# Altium footprint library Connectors.PcbLib: 268 footprints (part 9 of 21)
Each footprint in its own frame and in the unit in brackets; x right, y up, seen from the top. Pads: shape width x height; smd on the part's side, far side on the other; paste and mask are expansions set on the pad; w line width, h text height; cw(c..) or ccw(c..) is an arc to the next point about the centre after c.
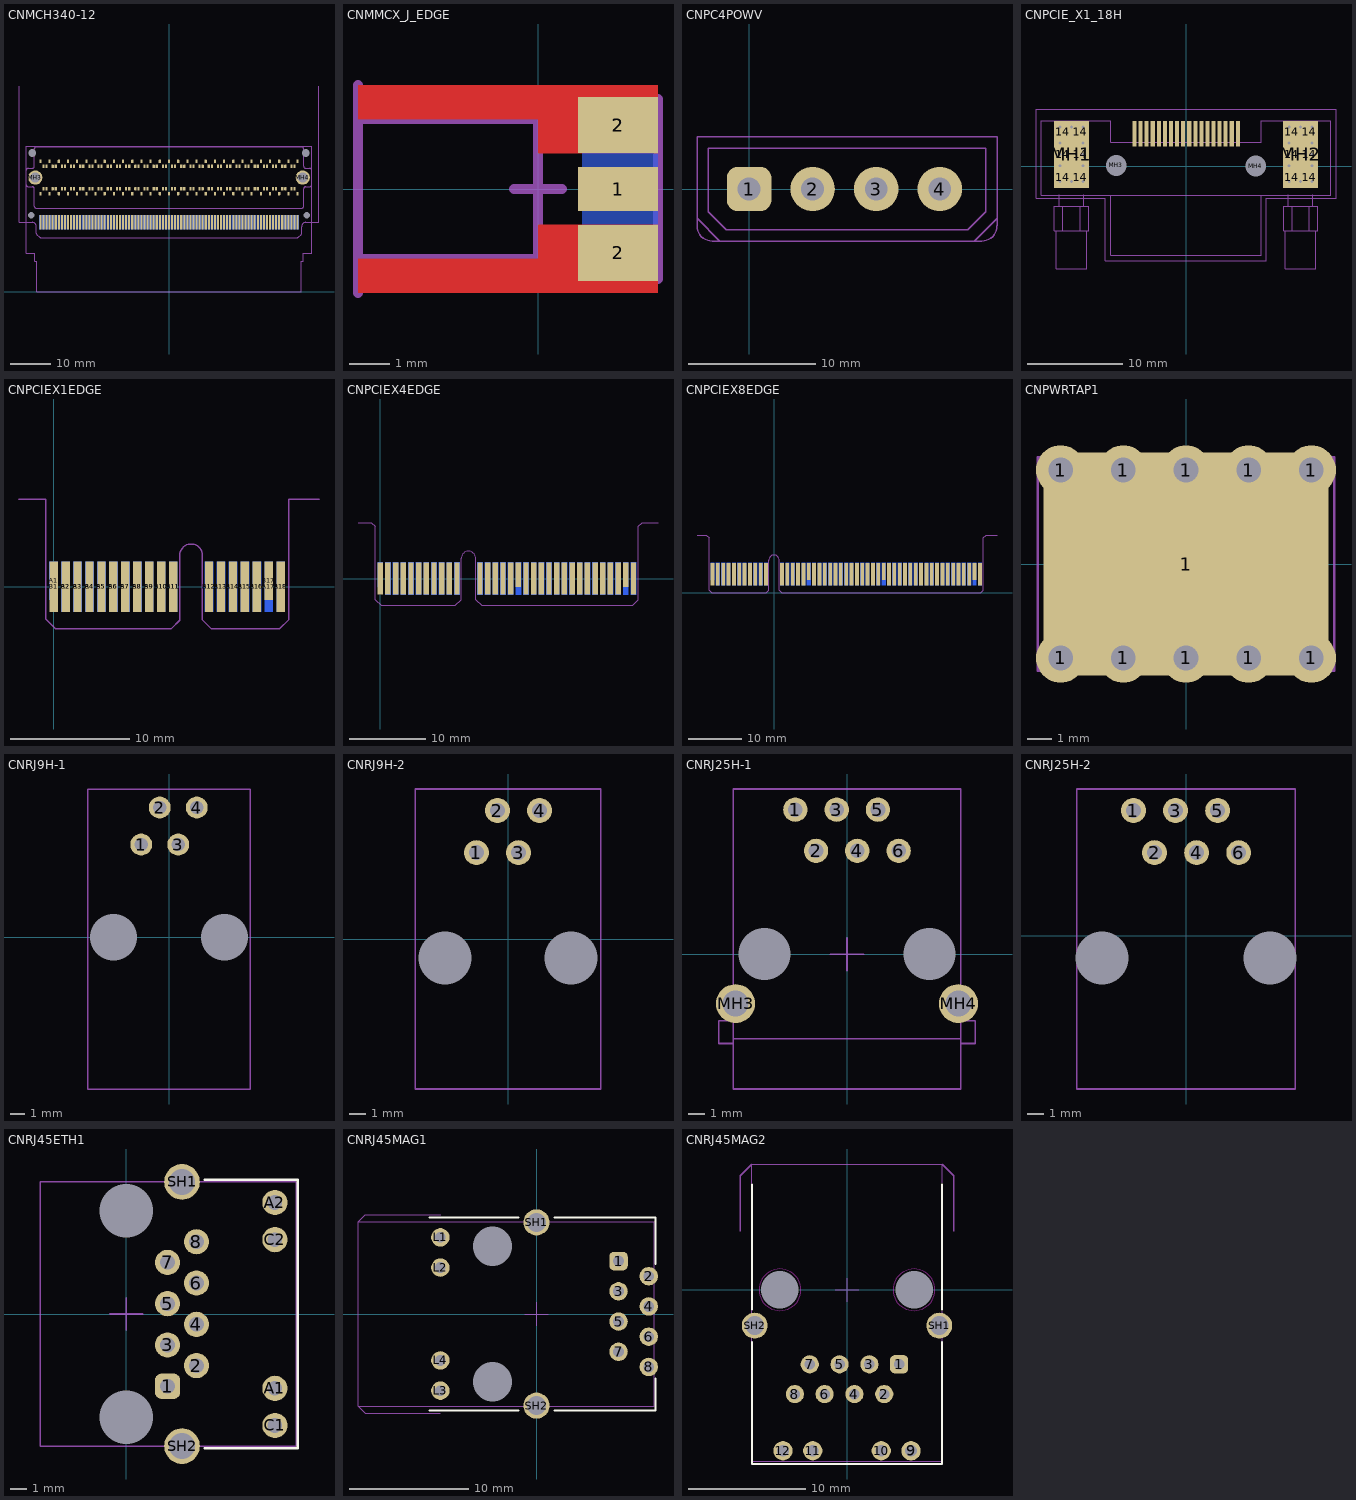
[diagram p8: the footprints below, top view; thin cyan lines are the x and y axes]

## CNMCH340-12 [mm] "MCH-1,2 horizontal connector plug 340 pin"
height 11.95
pads (348):
  rrect50% 0.53x0.9 smd: A1(31.5,31.95) A2(30.75,30.75) A3(30,30.75) A4(29.25,31.95) A5(28.5,30.75) A6(27.75,30.75) A7(27,31.95) A7(27,31.95) A8(26.25,30.75) A9(25.5,30.75) A10(24.75,31.95) A11(24,30.75) A12(23.25,30.75) A13(22.5,31.95) A14(21.75,30.75) A15(21,30.75) A16(20.25,31.95) A17(19.5,30.75) A18(18.75,30.75) A19(18,31.95) A20(17.25,30.75) A21(16.5,30.75) A22(15.75,31.95) A23(15,30.75) A24(14.25,30.75) A25(13.5,31.95) A26(12.75,30.75) A27(12,30.75) A28(11.25,31.95) A29(10.5,30.75) A30(9.75,30.75) A31(9,31.95) A32(8.25,30.75) A33(7.5,30.75) A34(6.75,31.95) A35(6,30.75) A36(5.25,30.75) A37(4.5,31.95) A38(3.75,30.75) A39(3,30.75) A40(2.25,31.95) A41(1.5,30.75) A42(0.75,30.75) A43(0,31.95) A44(-0.75,30.75) A45(-1.5,30.75) A46(-2.25,31.95) A47(-3,30.75) A48(-3.75,30.75) A49(-4.5,31.95) A50(-5.25,30.75) A51(-6,30.75) A52(-6.75,31.95) A53(-7.5,30.75) A54(-8.25,30.75) A55(-9,31.95) A56(-9.75,30.75) A57(-10.5,30.75) A58(-11.25,31.95) A59(-12,30.75) A60(-12.75,30.75) A61(-13.5,31.95) A62(-14.25,30.75) A63(-15,30.75) A64(-15.75,31.95) A65(-16.5,30.75) A66(-17.25,30.75) A67(-18,31.95) A68(-18.75,30.75) A69(-19.5,30.75) A70(-20.25,31.95) A71(-21,30.75) A72(-21.75,30.75) A73(-22.5,31.95) A74(-23.25,30.75) A75(-24,30.75) A76(-24.75,31.95) A77(-25.5,30.75) A78(-26.25,30.75) A79(-27,31.95) A80(-27.75,30.75) A81(-28.5,30.75) A82(-29.25,31.95) A83(-30,30.75) A84(-30.75,30.75) A85(-31.5,31.95) A86(-31.5,24.05) A87(-30.75,25.25) A88(-30,25.25) A89(-29.25,24.05) A90(-28.5,25.25) A91(-27.75,25.25) A92(-27,24.05) A93(-26.25,25.25) A94(-25.5,25.25) A95(-24.75,24.05) A96(-24,25.25) A97(-23.25,25.25) A98(-22.5,24.05) A99(-21.75,25.25) A100(-21,25.25) A101(-20.25,24.05) A102(-19.5,25.25) A103(-18.75,25.25) A104(-18,24.05) A105(-17.25,25.25) A106(-16.5,25.25) A107(-15.75,24.05) A108(-15,25.25) A109(-14.25,25.25) A110(-13.5,24.05) A111(-12.75,25.25) A112(-12,25.25) A113(-11.25,24.05) A114(-10.5,25.25) A115(-9.75,25.25) A116(-9,24.05) A117(-8.25,25.25) A118(-7.5,25.25) A119(-6.75,24.05) A120(-6,25.25) A121(-5.25,25.25) A122(-4.5,24.05) A123(-3.75,25.25) A124(-3,25.25) A125(-2.25,24.05) A126(-1.5,25.25) A127(-0.75,25.25) A128(0,24.05) A129(0.75,25.25) A130(1.5,25.25) A131(2.25,24.05) A132(3,25.25) A133(3.75,25.25) A134(4.5,24.05) A135(5.25,25.25) A136(6,25.25) A137(6.75,24.05) A138(7.5,25.25) A139(8.25,25.25) A140(9,24.05) A141(9.75,25.25) A142(10.5,25.25) A143(11.25,24.05) A144(12,25.25) A145(12.75,25.25) A146(13.5,24.05) A147(14.25,25.25) A148(15,25.25) A149(15.75,24.05) A150(16.5,25.25) A151(17.25,25.25) A152(18,24.05) A153(18.75,25.25) A154(19.5,25.25) A155(20.25,24.05) A156(21,25.25) A157(21.75,25.25) A158(22.5,24.05) A159(23.25,25.25) A160(24,25.25) A161(24.75,24.05) A162(25.5,25.25) A163(26.25,25.25) A164(27,24.05) A165(27.75,25.25) A166(28.5,25.25) A167(29.25,24.05) A168(30,25.25) A169(30.75,25.25) A170(31.5,24.05)
  rect 0.5x3.5 smd: B1(31.5,17.05) B2(30.75,17.05) B3(30,17.05) B4(29.25,17.05) B5(28.5,17.05) B6(27.75,17.05) B7(27,17.05) B8(26.25,17.05) B9(25.5,17.05) B10(24.75,17.05) B11(24,17.05) B12(23.25,17.05) B13(22.5,17.05) B14(21.75,17.05) B15(21,17.05) B16(20.25,17.05) B17(19.5,17.05) B18(18.75,17.05) B19(18,17.05) B20(17.25,17.05) B21(16.5,17.05) B22(15.75,17.05) B23(15,17.05) B24(14.25,17.05) B25(13.5,17.05) B26(12.75,17.05) B27(12,17.05) B28(11.25,17.05) B29(10.5,17.05) B30(9.75,17.05) B31(9,17.05) B32(8.25,17.05) B33(7.5,17.05) B34(6.75,17.05) B35(6,17.05) B36(5.25,17.05) B37(4.5,17.05) B38(3.75,17.05) B39(3,17.05) B40(2.25,17.05) B41(1.5,17.05) B42(0.75,17.05) B43(0,17.05) B44(-0.75,17.05) B45(-1.5,17.05) B46(-2.25,17.05) B47(-3,17.05) B48(-3.75,17.05) B49(-4.5,17.05) B50(-5.25,17.05) B51(-6,17.05) B52(-6.75,17.05) B53(-7.5,17.05) B54(-8.25,17.05) B55(-9,17.05) B56(-9.75,17.05) B57(-10.5,17.05) B58(-11.25,17.05) B59(-12,17.05) B60(-12.75,17.05) B61(-13.5,17.05) B62(-14.25,17.05) B63(-15,17.05) B64(-15.75,17.05) B65(-16.5,17.05) B66(-17.25,17.05) B67(-18,17.05) B68(-18.75,17.05) B69(-19.5,17.05) B70(-20.25,17.05) B71(-21,17.05) B72(-21.75,17.05) B73(-22.5,17.05) B74(-23.25,17.05) B75(-24,17.05) B76(-24.75,17.05) B77(-25.5,17.05) B78(-26.25,17.05) B79(-27,17.05) B80(-27.75,17.05) B81(-28.5,17.05) B82(-29.25,17.05) B83(-30,17.05) B84(-30.75,17.05) B85(-31.5,17.05)
  rect 0.5x3.5 smd far side: B86(-31.5,17.05) B86(-31.5,17.05) B87(-30.75,17.05) B88(-30,17.05) B89(-29.25,17.05) B90(-28.5,17.05) B91(-27.75,17.05) B92(-27,17.05) B93(-26.25,17.05) B94(-25.5,17.05) B95(-24.75,17.05) B96(-24,17.05) B97(-23.25,17.05) B98(-22.5,17.05) B99(-21.75,17.05) B100(-21,17.05) B101(-20.25,17.05) B102(-19.5,17.05) B103(-18.75,17.05) B104(-18,17.05) B105(-17.25,17.05) B106(-16.5,17.05) B107(-15.75,17.05) B108(-15,17.05) B109(-14.25,17.05) B110(-13.5,17.05) B111(-12.75,17.05) B112(-12,17.05) B113(-11.25,17.05) B114(-10.5,17.05) B115(-9.75,17.05) B116(-9,17.05) B117(-8.25,17.05) B118(-7.5,17.05) B119(-6.75,17.05) B120(-6,17.05) B121(-5.25,17.05) B122(-4.5,17.05) B123(-3.75,17.05) B124(-3,17.05) B125(-2.25,17.05) B126(-1.5,17.05) B127(-0.75,17.05) B128(0,17.05) B129(0.75,17.05) B130(1.5,17.05) B131(2.25,17.05) B132(3,17.05) B133(3.75,17.05) B134(4.5,17.05) B135(5.25,17.05) B136(6,17.05) B137(6.75,17.05) B138(7.5,17.05) B139(8.25,17.05) B140(9,17.05) B141(9.75,17.05) B142(10.5,17.05) B143(11.25,17.05) B144(12,17.05) B145(12.75,17.05) B146(13.5,17.05) B147(14.25,17.05) B148(15,17.05) B149(15.75,17.05) B150(16.5,17.05) B151(17.25,17.05) B152(18,17.05) B153(18.75,17.05) B154(19.5,17.05) B155(20.25,17.05) B156(21,17.05) B157(21.75,17.05) B158(22.5,17.05) B159(23.25,17.05) B160(24,17.05) B161(24.75,17.05) B162(25.5,17.05) B163(26.25,17.05) B164(27,17.05) B165(27.75,17.05) B166(28.5,17.05) B167(29.25,17.05) B168(30,17.05) B169(30.75,17.05) B170(31.5,17.05)
  rect 0x0 hole 1.9 unplated: MH1(-33.5,34) MH2(33.5,34)
  round 3.5 hole 2.5: MH3(-32.75,28) MH4(32.75,28)
  rect 0x0 hole 1.6 unplated: MH5(-33.75,18.8) MH6(33.75,18.8)
Mechanical 13:
  lines w0.102: -32.43,-0.002 -32.43,7.506 -32.88,7.506 -32.88,9.5 -35,9.5 -35,35.7 35,35.7 ; -32.43,0 32.43,0 32.43,7.508 32.88,7.508 32.88,9.502 35,9.502 35,35.702
Mechanical 14:
  lines w0.102: -35,26.25 ccw(c-34.5,26.25) -34.5,25.75 -33.5,25.75 cw(c-33.5,25.25) -33,25.25 -33,21 ccw(c-32.5,21) -32.5,20.5 32.5,20.5 ccw(c32.5,21) 33,21 33,25.25 cw(c33.5,25.25) 33.5,25.75 34.5,25.75 ccw(c34.5,26.25) 35,26.25 35,29.75 ccw(c34.5,29.75) 34.5,30.25 33.5,30.25 cw(c33.5,30.75) 33,30.75 33,35 ccw(c32.5,35) 32.5,35.5 -32.5,35.5 ccw(c-32.5,35) -33,35 -33,30.75 cw(c-33.5,30.75) -33.5,30.25 -34.5,30.25 ccw(c-34.5,29.75) -35,29.75 -35,26.25
Mechanical 15:
  lines w0.102: -36.75,50.383 -36.75,17 -33.516,17 ; -33.525,17 cw(c-33.525,15.975) -32.5,15.975 -32.5,14.391 ccw(c-32,14.391) -32.354,14.038 ; -32.36,14.032 -31.77,13.442 ; -31.766,13.446 ccw(c-31.412,13.8) -31.412,13.3 31.412,13.3 ccw(c31.412,13.8) 31.766,13.446 ; 31.77,13.442 32.36,14.032 ; 32.354,14.038 ccw(c32,14.391) 32.5,14.391 32.5,15.975 cw(c33.525,15.975) 33.525,17 36.75,17 36.75,50.383
3D body: height 9.01, standoff -3.01, extent 32.956,17.998 34.556,19.598
3D body: height 9.01, standoff -3.01, extent -34.544,17.998 -32.944,19.598
3D body: height 0, standoff -1.5, extent -34.437,33.06 -32.558,34.94
3D body: height 0, standoff -1.5, extent 32.563,33.06 34.442,34.94
3D body: height 7.77, standoff 6.27, extent -32.43,0 32.43,7.5
3D body: height 0.75, standoff -0.75, extent -32.43,0 32.43,7.5
3D body: height 9, standoff -3, extent -32.88,7.508 32.88,9.502
3D body: height 9, standoff -3, extent -35,9.5 35,20.3
3D body: height 7.02, standoff 3.7, extent -35,20.3 35,35.702
3D body: height 3.7, standoff 0, extent -35,20.3 35,35.702
3D body: height 6.27, standoff 6.26, extent -31.75,0.777 -31.267,7.495
3D body: height 6.27, standoff 6.26, extent -31,1.539 -30.517,7.495
3D body: height 6.27, standoff 6.26, extent -30.25,1.539 -29.767,7.495
3D body: height 6.27, standoff 6.26, extent -28,1.539 -27.517,7.495
3D body: height 6.27, standoff 6.26, extent -28.75,1.539 -28.267,7.495
3D body: height 6.27, standoff 6.26, extent -29.5,0.777 -29.017,7.495
3D body: height 6.27, standoff 6.26, extent -25.75,1.539 -25.267,7.495
3D body: height 6.27, standoff 6.26, extent -26.5,1.539 -26.017,7.495
3D body: height 6.27, standoff 6.26, extent -27.25,0.777 -26.767,7.495
3D body: height 6.27, standoff 6.26, extent -23.5,1.539 -23.017,7.495
3D body: height 6.27, standoff 6.26, extent -24.25,1.539 -23.767,7.495
3D body: height 6.27, standoff 6.26, extent -25,0.777 -24.517,7.495
3D body: height 6.27, standoff 6.26, extent -21.25,1.539 -20.767,7.495
3D body: height 6.27, standoff 6.26, extent -22,1.539 -21.517,7.495
3D body: height 6.27, standoff 6.26, extent -22.75,0.777 -22.267,7.495
3D body: height 6.27, standoff 6.26, extent -19,1.539 -18.517,7.495
3D body: height 6.27, standoff 6.26, extent -19.75,1.539 -19.267,7.495
3D body: height 6.27, standoff 6.26, extent -20.5,0.777 -20.017,7.495
3D body: height 6.27, standoff 6.26, extent -16.75,1.539 -16.267,7.495
3D body: height 6.27, standoff 6.26, extent -17.5,1.539 -17.017,7.495
3D body: height 6.27, standoff 6.26, extent -18.25,0.777 -17.767,7.495
3D body: height 6.27, standoff 6.26, extent -14.5,1.539 -14.017,7.495
3D body: height 6.27, standoff 6.26, extent -15.25,1.539 -14.767,7.495
3D body: height 6.27, standoff 6.26, extent -16,0.777 -15.517,7.495
3D body: height 6.27, standoff 6.26, extent -12.25,1.539 -11.767,7.495
3D body: height 6.27, standoff 6.26, extent -13,1.539 -12.517,7.495
3D body: height 6.27, standoff 6.26, extent -13.75,0.777 -13.267,7.495
3D body: height 6.27, standoff 6.26, extent -10,1.539 -9.517,7.495
3D body: height 6.27, standoff 6.26, extent -10.75,1.539 -10.267,7.495
3D body: height 6.27, standoff 6.26, extent -11.5,0.777 -11.017,7.495
3D body: height 6.27, standoff 6.26, extent -7.75,1.539 -7.267,7.495
3D body: height 6.27, standoff 6.26, extent -8.5,1.539 -8.017,7.495
3D body: height 6.27, standoff 6.26, extent -9.25,0.777 -8.767,7.495
3D body: height 6.27, standoff 6.26, extent -5.5,1.539 -5.017,7.495
3D body: height 6.27, standoff 6.26, extent -6.25,1.539 -5.767,7.495
3D body: height 6.27, standoff 6.26, extent -7,0.777 -6.517,7.495
3D body: height 6.27, standoff 6.26, extent -3.25,1.539 -2.767,7.495
3D body: height 6.27, standoff 6.26, extent -4,1.539 -3.517,7.495
3D body: height 6.27, standoff 6.26, extent -4.75,0.777 -4.267,7.495
3D body: height 6.27, standoff 6.26, extent -1,1.539 -0.517,7.495
3D body: height 6.27, standoff 6.26, extent -1.75,1.539 -1.267,7.495
3D body: height 6.27, standoff 6.26, extent -2.5,0.777 -2.017,7.495
3D body: height 6.27, standoff 6.26, extent 1.25,1.539 1.733,7.495
3D body: height 6.27, standoff 6.26, extent 0.5,1.539 0.983,7.495
3D body: height 6.27, standoff 6.26, extent -0.25,0.777 0.233,7.495
3D body: height 6.27, standoff 6.26, extent 3.5,1.539 3.983,7.495
3D body: height 6.27, standoff 6.26, extent 2.75,1.539 3.233,7.495
3D body: height 6.27, standoff 6.26, extent 2,0.777 2.483,7.495
3D body: height 6.27, standoff 6.26, extent 5.75,1.539 6.233,7.495
3D body: height 6.27, standoff 6.26, extent 5,1.539 5.483,7.495
3D body: height 6.27, standoff 6.26, extent 4.25,0.777 4.733,7.495
3D body: height 6.27, standoff 6.26, extent 8,1.539 8.483,7.495
3D body: height 6.27, standoff 6.26, extent 7.25,1.539 7.733,7.495
3D body: height 6.27, standoff 6.26, extent 6.5,0.777 6.983,7.495
3D body: height 6.27, standoff 6.26, extent 10.25,1.539 10.733,7.495
3D body: height 6.27, standoff 6.26, extent 9.5,1.539 9.983,7.495
3D body: height 6.27, standoff 6.26, extent 8.75,0.777 9.233,7.495
3D body: height 6.27, standoff 6.26, extent 12.5,1.539 12.983,7.495
3D body: height 6.27, standoff 6.26, extent 11.75,1.539 12.233,7.495
3D body: height 6.27, standoff 6.26, extent 11,0.777 11.483,7.495
3D body: height 6.27, standoff 6.26, extent 14.75,1.539 15.233,7.495
3D body: height 6.27, standoff 6.26, extent 14,1.539 14.483,7.495
3D body: height 6.27, standoff 6.26, extent 13.25,0.777 13.733,7.495
3D body: height 6.27, standoff 6.26, extent 17,1.539 17.483,7.495
3D body: height 6.27, standoff 6.26, extent 16.25,1.539 16.733,7.495
3D body: height 6.27, standoff 6.26, extent 15.5,0.777 15.983,7.495
3D body: height 6.27, standoff 6.26, extent 19.25,1.539 19.733,7.495
3D body: height 6.27, standoff 6.26, extent 18.5,1.539 18.983,7.495
3D body: height 6.27, standoff 6.26, extent 17.75,0.777 18.233,7.495
3D body: height 6.27, standoff 6.26, extent 21.5,1.539 21.983,7.495
3D body: height 6.27, standoff 6.26, extent 20.75,1.539 21.233,7.495
3D body: height 6.27, standoff 6.26, extent 20,0.777 20.483,7.495
3D body: height 6.27, standoff 6.26, extent 23.75,1.539 24.233,7.495
3D body: height 6.27, standoff 6.26, extent 23,1.539 23.483,7.495
3D body: height 6.27, standoff 6.26, extent 22.25,0.777 22.733,7.495
3D body: height 6.27, standoff 6.26, extent 26,1.539 26.483,7.495
3D body: height 6.27, standoff 6.26, extent 25.25,1.539 25.733,7.495
3D body: height 6.27, standoff 6.26, extent 24.5,0.777 24.983,7.495
3D body: height 6.27, standoff 6.26, extent 29.767,1.539 30.25,7.495
3D body: height 6.27, standoff 6.26, extent 30.517,1.539 31,7.495
3D body: height 6.27, standoff 6.26, extent 31.267,0.777 31.75,7.495
3D body: height 6.27, standoff 6.26, extent 28.25,1.539 28.733,7.495
3D body: height 6.27, standoff 6.26, extent 27.5,1.539 27.983,7.495
3D body: height 6.27, standoff 6.26, extent 26.75,0.777 27.233,7.495
3D body: height 6.27, standoff 6.26, extent 29,1.539 29.483,7.495
3D body: height 7.78, standoff 7.77, extent 29,1.539 29.483,7.495
3D body: height 7.78, standoff 7.77, extent 26.75,0.777 27.233,7.495
3D body: height 7.78, standoff 7.77, extent 27.5,1.539 27.983,7.495
3D body: height 7.78, standoff 7.77, extent 28.25,1.539 28.733,7.495
3D body: height 7.78, standoff 7.77, extent 31.267,0.777 31.75,7.495
3D body: height 7.78, standoff 7.77, extent 30.517,1.539 31,7.495
3D body: height 7.78, standoff 7.77, extent 29.767,1.539 30.25,7.495
3D body: height 7.78, standoff 7.77, extent 24.5,0.777 24.983,7.495
3D body: height 7.78, standoff 7.77, extent 25.25,1.539 25.733,7.495
3D body: height 7.78, standoff 7.77, extent 26,1.539 26.483,7.495
3D body: height 7.78, standoff 7.77, extent 22.25,0.777 22.733,7.495
3D body: height 7.78, standoff 7.77, extent 23,1.539 23.483,7.495
3D body: height 7.78, standoff 7.77, extent 23.75,1.539 24.233,7.495
3D body: height 7.78, standoff 7.77, extent 20,0.777 20.483,7.495
3D body: height 7.78, standoff 7.77, extent 20.75,1.539 21.233,7.495
3D body: height 7.78, standoff 7.77, extent 21.5,1.539 21.983,7.495
3D body: height 7.78, standoff 7.77, extent 17.75,0.777 18.233,7.495
3D body: height 7.78, standoff 7.77, extent 18.5,1.539 18.983,7.495
3D body: height 7.78, standoff 7.77, extent 19.25,1.539 19.733,7.495
3D body: height 7.78, standoff 7.77, extent 15.5,0.777 15.983,7.495
3D body: height 7.78, standoff 7.77, extent 16.25,1.539 16.733,7.495
3D body: height 7.78, standoff 7.77, extent 17,1.539 17.483,7.495
3D body: height 7.78, standoff 7.77, extent 13.25,0.777 13.733,7.495
3D body: height 7.78, standoff 7.77, extent 14,1.539 14.483,7.495
3D body: height 7.78, standoff 7.77, extent 14.75,1.539 15.233,7.495
3D body: height 7.78, standoff 7.77, extent 11,0.777 11.483,7.495
3D body: height 7.78, standoff 7.77, extent 11.75,1.539 12.233,7.495
3D body: height 7.78, standoff 7.77, extent 12.5,1.539 12.983,7.495
3D body: height 7.78, standoff 7.77, extent 8.75,0.777 9.233,7.495
3D body: height 7.78, standoff 7.77, extent 9.5,1.539 9.983,7.495
3D body: height 7.78, standoff 7.77, extent 10.25,1.539 10.733,7.495
3D body: height 7.78, standoff 7.77, extent 6.5,0.777 6.983,7.495
3D body: height 7.78, standoff 7.77, extent 7.25,1.539 7.733,7.495
3D body: height 7.78, standoff 7.77, extent 8,1.539 8.483,7.495
3D body: height 7.78, standoff 7.77, extent 4.25,0.777 4.733,7.495
3D body: height 7.78, standoff 7.77, extent 5,1.539 5.483,7.495
3D body: height 7.78, standoff 7.77, extent 5.75,1.539 6.233,7.495
3D body: height 7.78, standoff 7.77, extent 2,0.777 2.483,7.495
3D body: height 7.78, standoff 7.77, extent 2.75,1.539 3.233,7.495
3D body: height 7.78, standoff 7.77, extent 3.5,1.539 3.983,7.495
3D body: height 7.78, standoff 7.77, extent -0.25,0.777 0.233,7.495
3D body: height 7.78, standoff 7.77, extent 0.5,1.539 0.983,7.495
3D body: height 7.78, standoff 7.77, extent 1.25,1.539 1.733,7.495
3D body: height 7.78, standoff 7.77, extent -2.5,0.777 -2.017,7.495
3D body: height 7.78, standoff 7.77, extent -1.75,1.539 -1.267,7.495
3D body: height 7.78, standoff 7.77, extent -1,1.539 -0.517,7.495
3D body: height 7.78, standoff 7.77, extent -4.75,0.777 -4.267,7.495
3D body: height 7.78, standoff 7.77, extent -4,1.539 -3.517,7.495
3D body: height 7.78, standoff 7.77, extent -3.25,1.539 -2.767,7.495
3D body: height 7.78, standoff 7.77, extent -7,0.777 -6.517,7.495
3D body: height 7.78, standoff 7.77, extent -6.25,1.539 -5.767,7.495
3D body: height 7.78, standoff 7.77, extent -5.5,1.539 -5.017,7.495
3D body: height 7.78, standoff 7.77, extent -9.25,0.777 -8.767,7.495
3D body: height 7.78, standoff 7.77, extent -8.5,1.539 -8.017,7.495
3D body: height 7.78, standoff 7.77, extent -7.75,1.539 -7.267,7.495
3D body: height 7.78, standoff 7.77, extent -11.5,0.777 -11.017,7.495
3D body: height 7.78, standoff 7.77, extent -10.75,1.539 -10.267,7.495
3D body: height 7.78, standoff 7.77, extent -10,1.539 -9.517,7.495
3D body: height 7.78, standoff 7.77, extent -13.75,0.777 -13.267,7.495
3D body: height 7.78, standoff 7.77, extent -13,1.539 -12.517,7.495
3D body: height 7.78, standoff 7.77, extent -12.25,1.539 -11.767,7.495
3D body: height 7.78, standoff 7.77, extent -16,0.777 -15.517,7.495
3D body: height 7.78, standoff 7.77, extent -15.25,1.539 -14.767,7.495
3D body: height 7.78, standoff 7.77, extent -14.5,1.539 -14.017,7.495
3D body: height 7.78, standoff 7.77, extent -18.25,0.777 -17.767,7.495
3D body: height 7.78, standoff 7.77, extent -17.5,1.539 -17.017,7.495
3D body: height 7.78, standoff 7.77, extent -16.75,1.539 -16.267,7.495
3D body: height 7.78, standoff 7.77, extent -20.5,0.777 -20.017,7.495
3D body: height 7.78, standoff 7.77, extent -19.75,1.539 -19.267,7.495
3D body: height 7.78, standoff 7.77, extent -19,1.539 -18.517,7.495
3D body: height 7.78, standoff 7.77, extent -22.75,0.777 -22.267,7.495
3D body: height 7.78, standoff 7.77, extent -22,1.539 -21.517,7.495
3D body: height 7.78, standoff 7.77, extent -21.25,1.539 -20.767,7.495
3D body: height 7.78, standoff 7.77, extent -25,0.777 -24.517,7.495
3D body: height 7.78, standoff 7.77, extent -24.25,1.539 -23.767,7.495
3D body: height 7.78, standoff 7.77, extent -23.5,1.539 -23.017,7.495
3D body: height 7.78, standoff 7.77, extent -27.25,0.777 -26.767,7.495
3D body: height 7.78, standoff 7.77, extent -26.5,1.539 -26.017,7.495
3D body: height 7.78, standoff 7.77, extent -25.75,1.539 -25.267,7.495
3D body: height 7.78, standoff 7.77, extent -29.5,0.777 -29.017,7.495
3D body: height 7.78, standoff 7.77, extent -28.75,1.539 -28.267,7.495
3D body: height 7.78, standoff 7.77, extent -28,1.539 -27.517,7.495
3D body: height 7.78, standoff 7.77, extent -30.25,1.539 -29.767,7.495
3D body: height 7.78, standoff 7.77, extent -31,1.539 -30.517,7.495
3D body: height 7.78, standoff 7.77, extent -31.75,0.777 -31.267,7.495
3D body: height -0.75, standoff -0.76, extent 29,1.539 29.483,7.495
3D body: height -0.75, standoff -0.76, extent 26.75,0.777 27.233,7.495
3D body: height -0.75, standoff -0.76, extent 27.5,1.539 27.983,7.495
3D body: height -0.75, standoff -0.76, extent 28.25,1.539 28.733,7.495
3D body: height -0.75, standoff -0.76, extent 31.267,0.777 31.75,7.495
3D body: height -0.75, standoff -0.76, extent 30.517,1.539 31,7.495
3D body: height -0.75, standoff -0.76, extent 29.767,1.539 30.25,7.495
3D body: height -0.75, standoff -0.76, extent 24.5,0.777 24.983,7.495
3D body: height -0.75, standoff -0.76, extent 25.25,1.539 25.733,7.495
3D body: height -0.75, standoff -0.76, extent 26,1.539 26.483,7.495
3D body: height -0.75, standoff -0.76, extent 22.25,0.777 22.733,7.495
3D body: height -0.75, standoff -0.76, extent 23,1.539 23.483,7.495
3D body: height -0.75, standoff -0.76, extent 23.75,1.539 24.233,7.495
3D body: height -0.75, standoff -0.76, extent 20,0.777 20.483,7.495
3D body: height -0.75, standoff -0.76, extent 20.75,1.539 21.233,7.495
3D body: height -0.75, standoff -0.76, extent 21.5,1.539 21.983,7.495
3D body: height -0.75, standoff -0.76, extent 17.75,0.777 18.233,7.495
3D body: height -0.75, standoff -0.76, extent 18.5,1.539 18.983,7.495
3D body: height -0.75, standoff -0.76, extent 19.25,1.539 19.733,7.495
3D body: height -0.75, standoff -0.76, extent 15.5,0.777 15.983,7.495
3D body: height -0.75, standoff -0.76, extent 16.25,1.539 16.733,7.495
3D body: height -0.75, standoff -0.76, extent 17,1.539 17.483,7.495
3D body: height -0.75, standoff -0.76, extent 13.25,0.777 13.733,7.495
3D body: height -0.75, standoff -0.76, extent 14,1.539 14.483,7.495
3D body: height -0.75, standoff -0.76, extent 14.75,1.539 15.233,7.495
3D body: height -0.75, standoff -0.76, extent 11,0.777 11.483,7.495
3D body: height -0.75, standoff -0.76, extent 11.75,1.539 12.233,7.495
3D body: height -0.75, standoff -0.76, extent 12.5,1.539 12.983,7.495
3D body: height -0.75, standoff -0.76, extent 8.75,0.777 9.233,7.495
3D body: height -0.75, standoff -0.76, extent 9.5,1.539 9.983,7.495
3D body: height -0.75, standoff -0.76, extent 10.25,1.539 10.733,7.495
3D body: height -0.75, standoff -0.76, extent 6.5,0.777 6.983,7.495
3D body: height -0.75, standoff -0.76, extent 7.25,1.539 7.733,7.495
3D body: height -0.75, standoff -0.76, extent 8,1.539 8.483,7.495
3D body: height -0.75, standoff -0.76, extent 4.25,0.777 4.733,7.495